# Altium footprint library Pezo_imp.PCBLIB: 98 footprints (part 4 of 7)
Each footprint in its own frame and in the unit in brackets; x right, y up, seen from the top. Pads: shape width x height; smd on the part's side, far side on the other; paste and mask are expansions set on the pad; w line width, h text height; cw(c..) or ccw(c..) is an arc to the next point about the centre after c.
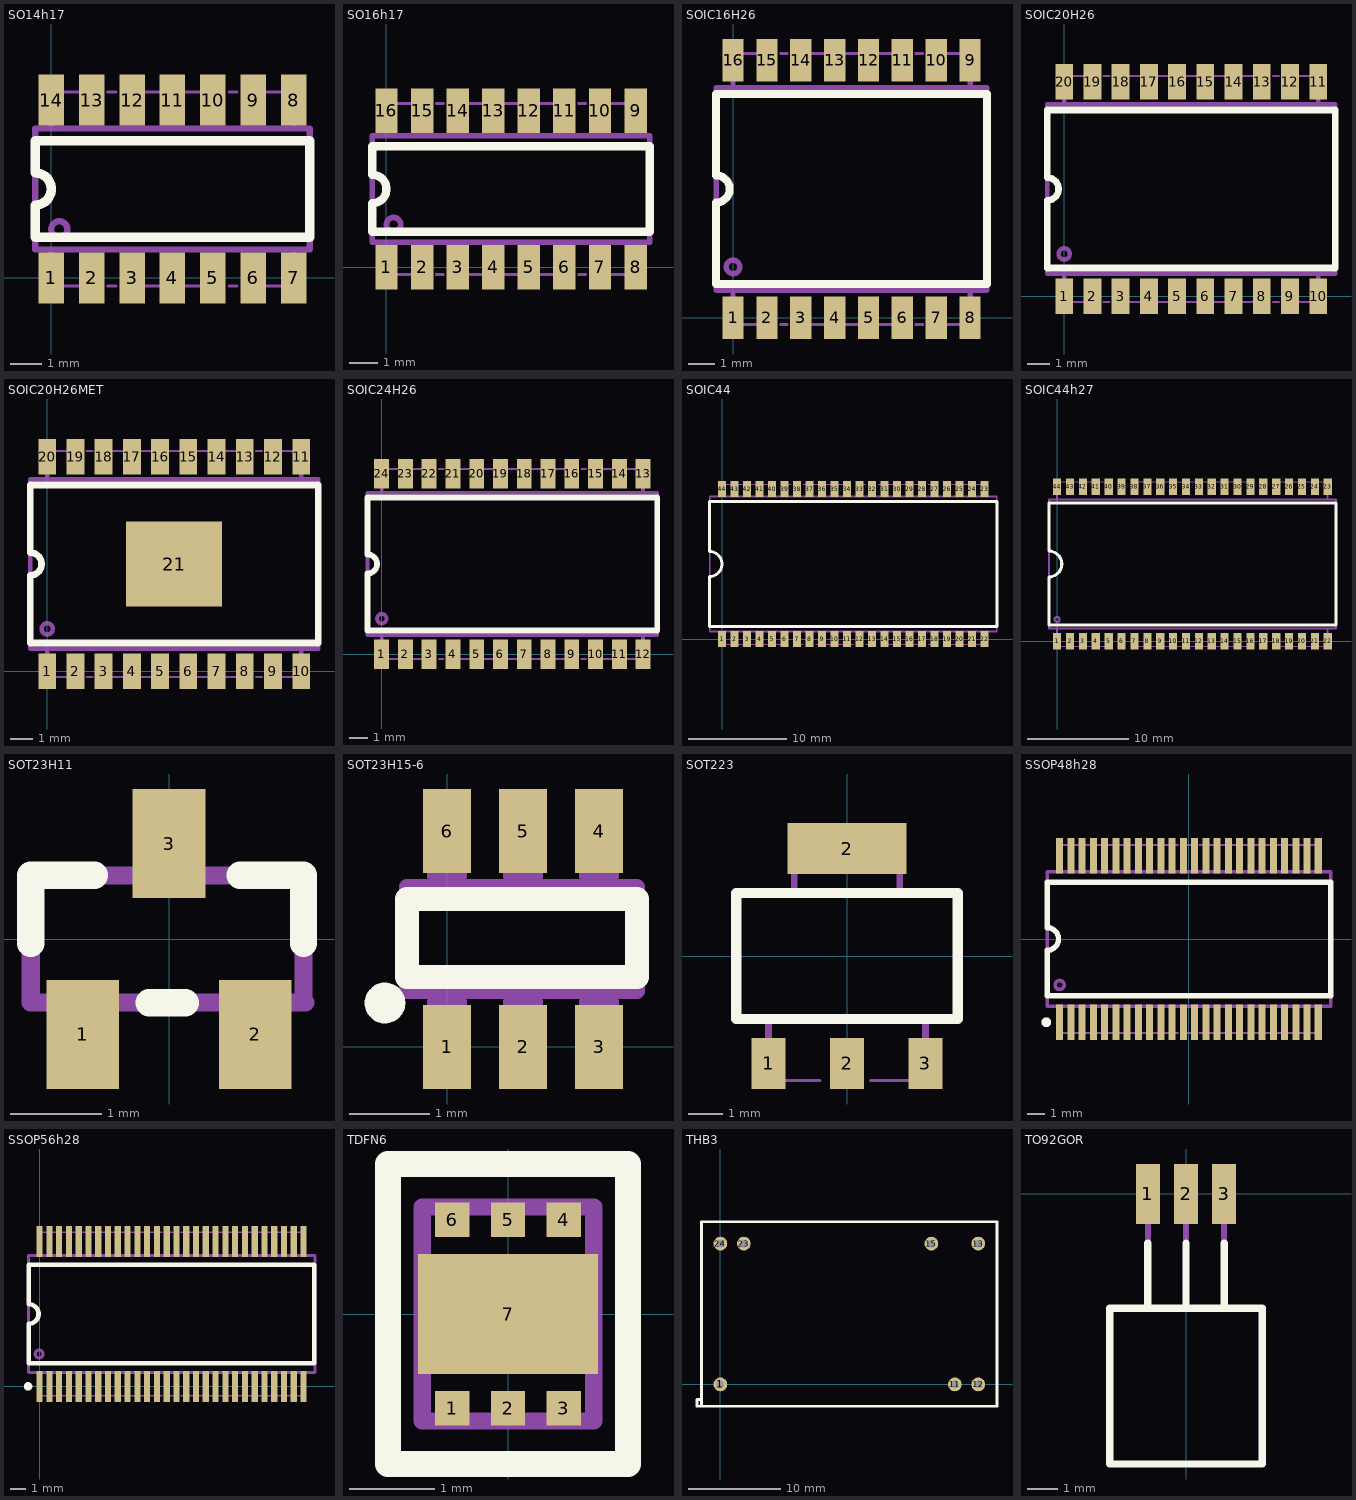
[diagram p3: the footprints below, top view; thin cyan lines are the x and y axes]

## SO14h17 [mm]
height 1.7
pads (14):
  rect 0.8x1.6 smd: 1(0,0) 2(1.27,0) 3(2.54,0) 4(3.81,0) 5(5.08,0) 6(6.35,0) 7(7.62,0) 8(7.62,5.588) 9(6.35,5.588) 10(5.08,5.588) 11(3.81,5.588) 12(2.54,5.588) 13(1.27,5.588) 14(0,5.588)
Top Overlay:
  lines w0.3: -0.508,1.27 8.128,1.27 8.128,4.318 -0.508,4.318 -0.508,3.302 cw(c-0.508,2.794) -0.508,2.286 -0.508,1.27
Mechanical 1:
  circle w0.2: c0.254,1.524 r0.254
  lines w0.1: 0,-0.254 1.27,-0.254 ; 0,5.842 1.27,5.842 ; 1.778,-0.254 2.032,-0.254 ; 1.778,5.842 2.032,5.842 ; 2.54,-0.254 5.08,-0.254 ; 2.54,5.842 5.08,5.842 ; 5.588,-0.254 5.842,-0.254 ; 5.588,5.842 5.842,5.842 ; 6.35,-0.254 7.62,-0.254 ; 6.35,5.842 7.62,5.842
  lines w0.2: 0,-0.254 0,0.762 ; 0,4.826 0,5.842 ; 7.62,-0.254 7.62,0.762 ; 7.62,4.826 7.62,5.842 ; -0.508,0.889 8.128,0.889 8.128,4.699 -0.508,4.699 -0.508,0.889
  text ".Designator" at 2.05,3.48 h1.5
  text ".Comment" at 0.97,2.06 h1.5
  text "14" at 0.01,3.4 h1.5
3D body "SO14h17.stp": height 1.71, standoff 0, extent -0.6,-0.35 8.21,5.95

## SO16h17 [mm]
height 1.7
pads (16):
  rect 0.8x1.6 smd: 1(0,0) 2(1.27,0) 3(2.54,0) 4(3.81,0) 5(5.08,0) 6(6.35,0) 7(7.62,0) 8(8.89,0) 9(8.89,5.588) 10(7.62,5.588) 11(6.35,5.588) 12(5.08,5.588) 13(3.81,5.588) 14(2.54,5.588) 15(1.27,5.588) 16(0,5.588)
Top Overlay:
  lines w0.3: -0.508,1.27 9.398,1.27 9.398,4.318 -0.508,4.318 -0.508,3.302 cw(c-0.508,2.794) -0.508,2.286 -0.508,1.27
Mechanical 1:
  circle w0.2: c0.254,1.524 r0.254
  lines w0.1: 0,-0.254 1.27,-0.254 ; 0,5.842 1.27,5.842 ; 1.778,-0.254 2.032,-0.254 ; 1.778,5.842 2.032,5.842 ; 2.54,-0.254 6.35,-0.254 ; 2.54,5.842 6.35,5.842 ; 6.858,-0.254 7.112,-0.254 ; 6.858,5.842 7.112,5.842 ; 7.62,-0.254 8.89,-0.254 ; 7.62,5.842 8.89,5.842
  lines w0.2: 0,-0.254 0,0.762 ; 0,4.826 0,5.842 ; 8.89,-0.254 8.89,0.762 ; 8.89,4.826 8.89,5.842 ; -0.508,0.889 9.398,0.889 9.398,4.699 -0.508,4.699 -0.508,0.889
  text ".Comment" at 1.47,1.76 h1.5
  text ".Designator" at 2.55,3.18 h1.5
  text "16" at -0.127,3.556 h1.5
3D body "SO16h17.stp": height 1.71, standoff 0, extent -0.595,-0.356 9.485,5.944

## SOIC16H26 [mm]
height 2.6
pads (16):
  rect 0.8x1.6 smd: 1(0,0) 2(1.27,0) 3(2.54,0) 4(3.81,0) 5(5.08,0) 6(6.35,0) 7(7.62,0) 8(8.89,0) 9(8.89,9.652) 10(7.62,9.652) 11(6.35,9.652) 12(5.08,9.652) 13(3.81,9.652) 14(2.54,9.652) 15(1.27,9.652) 16(0,9.652)
Top Overlay:
  lines w0.3: -0.635,1.27 9.525,1.27 9.525,8.382 -0.635,8.382 -0.635,5.334 cw(c-0.635,4.826) -0.635,4.318 -0.635,1.27
Mechanical 1:
  circle w0.2: c0,1.905 r0.254
  lines w0.1: 0,-0.254 1.27,-0.254 ; 0,9.906 1.27,9.906 ; 1.778,-0.254 2.032,-0.254 ; 1.778,9.906 2.032,9.906 ; 2.54,-0.254 6.35,-0.254 ; 2.54,9.906 6.35,9.906 ; 6.858,-0.254 7.112,-0.254 ; 6.858,9.906 7.112,9.906 ; 7.62,-0.254 8.89,-0.254 ; 7.62,9.906 8.89,9.906
  lines w0.2: 0,-0.254 0,1.016 ; 0,8.636 0,9.906 ; 8.89,-0.254 8.89,1.016 ; 8.89,8.636 8.89,9.906 ; -0.635,1.016 9.525,1.016 9.525,8.636 -0.635,8.636 -0.635,1.016
  text ".Designator" at 2.78,5.28 h1.5
  text ".Comment" at 1.19,3.58 h1.5
  text "16" at 0,7 h1.5
3D body "SOIC16h26.stp": height 2.61, standoff 0, extent -0.8,-0.5 9.7,10.15

## SOIC20H26 [mm]
height 2.6
pads (20):
  rect 0.8x1.6 smd: 1(0,0) 2(1.27,0) 3(2.54,0) 4(3.81,0) 5(5.08,0) 6(6.35,0) 7(7.62,0) 8(8.89,0) 9(10.16,0) 10(11.43,0) 11(11.43,9.652) 12(10.16,9.652) 13(8.89,9.652) 14(7.62,9.652) 15(6.35,9.652) 16(5.08,9.652) 17(3.81,9.652) 18(2.54,9.652) 19(1.27,9.652) 20(0,9.652)
Top Overlay:
  lines w0.3: -0.76,1.27 12.19,1.27 12.19,8.382 -0.76,8.382 -0.76,5.334 cw(c-0.76,4.826) -0.76,4.318 -0.76,1.27
Mechanical 1:
  circle w0.2: c0,1.905 r0.254
  lines w0.1: 0,-0.254 1.27,-0.254 ; 0,9.906 1.27,9.906 ; 1.778,-0.254 2.032,-0.254 ; 1.778,9.906 2.032,9.906 ; 2.54,-0.254 8.89,-0.254 ; 2.54,9.906 8.89,9.906 ; 9.398,-0.254 9.652,-0.254 ; 9.398,9.906 9.652,9.906 ; 10.16,-0.254 11.43,-0.254 ; 10.16,9.906 11.43,9.906
  lines w0.2: 0,-0.254 0,1.016 ; 0,8.636 0,9.906 ; 11.43,-0.254 11.43,1.016 ; 11.43,8.636 11.43,9.906 ; -0.76,1.016 12.19,1.016 12.19,8.636 -0.76,8.636 -0.76,1.016
  text ".Designator" at 4.455,5.28 h1.5
  text ".Comment" at 2.865,3.58 h1.5
  text "20" at 0,7 h1.5
3D body "SOIC20h26.stp": height 2.61, standoff 0, extent -0.76,-0.499 12.19,10.151

## SOIC20H26MET [mm]
height 2.6
pads (21):
  rect 0.8x1.6 smd: 1(0,0) 2(1.27,0) 3(2.54,0) 4(3.81,0) 5(5.08,0) 6(6.35,0) 7(7.62,0) 8(8.89,0) 9(10.16,0) 10(11.43,0) 11(11.43,9.652) 12(10.16,9.652) 13(8.89,9.652) 14(7.62,9.652) 15(6.35,9.652) 16(5.08,9.652) 17(3.81,9.652) 18(2.54,9.652) 19(1.27,9.652) 20(0,9.652)
  rect 4.32x3.81 smd: 21(5.715,4.826)
Top Overlay:
  lines w0.3: -0.76,1.27 12.19,1.27 12.19,8.382 -0.76,8.382 -0.76,5.334 cw(c-0.76,4.826) -0.76,4.318 -0.76,1.27
Mechanical 1:
  circle w0.2: c0,1.905 r0.254
  lines w0.1: 0,-0.254 1.27,-0.254 ; 0,9.906 1.27,9.906 ; 1.778,-0.254 2.032,-0.254 ; 1.778,9.906 2.032,9.906 ; 2.54,-0.254 8.89,-0.254 ; 2.54,9.906 8.89,9.906 ; 9.398,-0.254 9.652,-0.254 ; 9.398,9.906 9.652,9.906 ; 10.16,-0.254 11.43,-0.254 ; 10.16,9.906 11.43,9.906
  lines w0.2: 0,-0.254 0,1.016 ; 0,8.636 0,9.906 ; 11.43,-0.254 11.43,1.016 ; 11.43,8.636 11.43,9.906 ; -0.76,1.016 12.19,1.016 12.19,8.636 -0.76,8.636 -0.76,1.016
  text ".Designator" at 4.455,5.28 h1.5
  text ".Comment" at 2.865,3.58 h1.5
  text "20" at 0,7 h1.5
3D body "SOIC20h26.stp": height 2.61, standoff 0, extent -0.76,-0.499 12.19,10.151

## SOIC24H26 [mm]
height 2.6
pads (24):
  rect 0.8x1.6 smd: 1(0,0) 2(1.27,0) 3(2.54,0) 4(3.81,0) 5(5.08,0) 6(6.35,0) 7(7.62,0) 8(8.89,0) 9(10.16,0) 10(11.43,0) 11(12.7,0) 12(13.97,0) 13(13.97,9.652) 14(12.7,9.652) 15(11.43,9.652) 16(10.16,9.652) 17(8.89,9.652) 18(7.62,9.652) 19(6.35,9.652) 20(5.08,9.652) 21(3.81,9.652) 22(2.54,9.652) 23(1.27,9.652) 24(0,9.652)
Top Overlay:
  lines w0.3: -0.76,1.27 -0.76,4.318 ccw(c-0.76,4.826) -0.76,5.334 -0.76,8.382 14.73,8.382 14.73,1.27 -0.76,1.27
Mechanical 1:
  circle w0.2: c0,1.905 r0.254
  lines w0.1: 0,-0.254 2.54,-0.254 ; 0,9.906 2.54,9.906 ; 3.048,-0.254 3.302,-0.254 ; 3.048,9.906 3.302,9.906 ; 3.81,-0.254 10.16,-0.254 ; 3.81,9.906 10.16,9.906 ; 10.668,-0.254 10.922,-0.254 ; 10.668,9.906 10.922,9.906 ; 11.43,-0.254 13.97,-0.254 ; 11.43,9.906 13.97,9.906
  lines w0.2: 0,-0.254 0,1.016 ; 0,8.636 0,9.906 ; 13.97,-0.254 13.97,1.016 ; 13.97,8.636 13.97,9.906 ; -0.76,1.016 -0.76,8.636 14.73,8.636 14.73,1.016 -0.76,1.016
  text "24" at 0,7 h1.5
  text ".Comment" at 3.88,3.605 h1.5
  text ".Designator" at 5.85,5.311 h1.5
3D body "SOIC24h26.stp": height 2.61, standoff 0, extent -0.76,-0.499 14.73,10.151

## SOIC44 [mil]
height 106.3
pads (44):
  rect 32x63 smd: 1(0,0) 2(50,0) 3(100,0) 4(150,0) 5(200,0) 6(250,0) 7(300,0) 8(350,0) 9(400,0) 10(450,0) 11(500,0) 12(550,0) 13(600,0) 14(650,0) 15(700,0) 16(750,0) 17(800,0) 18(850,0) 19(900,0) 20(950,0) 21(1000,0) 22(1050,0) 23(1050,600) 24(1000,600) 25(950,600) 26(900,600) 27(850,600) 28(800,600) 29(750,600) 30(700,600) 31(650,600) 32(600,600) 33(550,600) 34(500,600) 35(450,600) 36(400,600) 37(350,600) 38(300,600) 39(250,600) 40(200,600) 41(150,600) 42(100,600) 43(50,600) 44(0,600)
Top Overlay:
  lines w11.81: -50,50 -50,250 ccw(c-50,300) -50,350 -50,550 1100,550 1100,50 -50,50
Mechanical 1:
  lines w3.94: 0,-20 25,-20 50,-20 100,-20 250,-20 ; 0,620 200,620 ; 250,620 275,620 ; 300,-20 325,-20 ; 325,620 500,620 ; 375,-20 525,-20 ; 550,620 575,620 ; 575,-20 600,-20 ; 625,620 800,620 ; 650,-20 800,-20 ; 825,-20 850,-20 ; 825,620 850,620 ; 900,-20 1050,-20 ; 900,620 1050,620
  lines w7.87: 0,-20 0,30 ; 0,570 0,620 ; 1050,-20 1050,30 ; 1050,570 1050,620 ; -49,30 -49,570 1099,570 1099,30 -49,30
  text "1" at -28.65,50.52 h59.06
  text "44" at -19.68,511.81 h59.06

## SOIC44h27 [mm]
height 2.7
pads (44):
  rect 0.8x1.6 smd: 1(0,0) 2(1.27,0) 3(2.54,0) 4(3.81,0) 5(5.08,0) 6(6.35,0) 7(7.62,0) 8(8.89,0) 9(10.16,0) 10(11.43,0) 11(12.7,0) 12(13.97,0) 13(15.24,0) 14(16.51,0) 15(17.78,0) 16(19.05,0) 17(20.32,0) 18(21.59,0) 19(22.86,0) 20(24.13,0) 21(25.4,0) 22(26.67,0) 23(26.67,15.24) 24(25.4,15.24) 25(24.13,15.24) 26(22.86,15.24) 27(21.59,15.24) 28(20.32,15.24) 29(19.05,15.24) 30(17.78,15.24) 31(16.51,15.24) 32(15.24,15.24) 33(13.97,15.24) 34(12.7,15.24) 35(11.43,15.24) 36(10.16,15.24) 37(8.89,15.24) 38(7.62,15.24) 39(6.35,15.24) 40(5.08,15.24) 41(3.81,15.24) 42(2.54,15.24) 43(1.27,15.24) 44(0,15.24)
Top Overlay:
  lines w0.3: -0.815,1.62 27.485,1.62 27.485,13.62 -0.815,13.62 -0.815,8.89 cw(c-0.815,7.62) -0.815,6.35 -0.815,1.62 ; -0.815,1.62 -0.77,1.62 -0.815,1.62
Mechanical 1:
  circle w0.2: c0,2.159 r0.254
  lines w0.1: 0,-0.508 5.08,-0.508 ; 0,15.748 5.08,15.748 ; 6.223,-0.508 6.477,-0.508 ; 6.223,15.748 6.477,15.748 ; 7.62,-0.508 19.05,-0.508 ; 7.62,15.748 19.05,15.748 ; 20.193,-0.508 20.447,-0.508 ; 20.193,15.748 20.447,15.748 ; 21.59,-0.508 26.67,-0.508 ; 21.59,15.748 26.67,15.748
  lines w0.2: 0,-0.508 0,1.28 ; 0,13.96 0,15.748 ; 26.67,-0.508 26.67,1.28 ; 26.67,13.96 26.67,15.748 ; -0.8,1.28 -0.8,13.96 27.47,13.96 27.47,1.28 -0.8,1.28
  text ".Comment" at 10.866,6.501 h1.5
  text ".Designator" at 12.456,8.201 h1.5
  text "44" at 0,12.446 h1.5
3D body "SOIC44h27.stp": height 2.71, standoff 0, extent -0.8,-0.53 27.47,15.77

## SOT23H11 [mm]
height 1.1
pads (3):
  rect 0.8x1.2 smd: 1(-0.95,-1.05) 2(0.95,-1.05) 3(0,1.05)
Top Overlay:
  lines w0.3: -1.52,-0.05 -1.52,0.7 -0.82,0.7 ; -0.22,-0.7 0.18,-0.7 ; 0.78,0.7 1.48,0.7 1.48,-0.05
Mechanical 1:
  lines w0.2: -0.97,-1.3 -0.97,-0.7 ; 0,0.7 0,1.3 ; 0.93,-1.3 0.93,-0.7 ; 1.48,-0.7 1.48,0.7 ; 1.5,-0.7 -1.52,-0.7 -1.52,0.7 1.5,0.7
  text ".Comment" at -2.72,-2.58 h1.5
  text ".Designator" at -1.66,1.85 h1.5
3D body "SOT23h11.stp": height 1.1, standoff 0, extent -1.5,-1.25 1.5,1.25

## SOT23H15-6 [mm]
height 1.5
pads (6):
  rect 0.6x1.05 smd: 1(0,0) 2(0.95,0) 3(1.9,0) 4(1.9,2.7) 5(0.95,2.7) 6(0,2.7)
Top Overlay:
  circle w0.254: c-0.777,0.55 r0.127
  lines w0.3: -0.5,0.875 2.375,0.875 2.375,1.85 -0.5,1.85 -0.5,0.875
Mechanical 1:
  lines w0.2: -0.025,2 0,2 ; -0.5,0.7 2.375,0.7 2.375,2 -0.5,2 -0.5,0.7
  lines w0.5: 0,-0.15 0,0.55 ; 0,2.15 0,2.85 ; 0.95,-0.15 0.95,0.55 ; 0.95,2.15 0.95,2.85 ; 1.9,-0.15 1.9,0.55 ; 1.9,2.15 1.9,2.85
  text ".Designator" at -0.7,3.25 h1.5
  text ".Comment" at -0.823,-1.452 h1.5
  text "1" at -1.3,-0.85 h1.5

## SOT223 [mm]
height 1.7
pads (4):
  rect 1x1.5 smd: 1(-2.3,-3.15) 2(0,-3.15) 3(2.3,-3.15)
  rect 3.5x1.5 smd: 2(0,3.15)
Top Overlay:
  lines w0.3: -3.25,-1.85 -3.25,1.85 3.25,1.85 3.25,-1.85 -3.25,-1.85
Mechanical 1:
  lines w0.1: -2.3,-3.65 -0.8,-3.65 ; -0.175,-3.65 0.075,-3.65 ; 0.7,-3.65 2.3,-3.65
  lines w0.2: -2.3,-3.65 -2.3,-1.9 ; -1.55,1.85 -1.55,3.65 1.55,3.65 1.55,1.85 ; 2.3,-3.65 2.3,-1.9 ; -3.25,-1.85 -3.25,1.85 3.25,1.85 3.25,-1.85 -3.25,-1.85
  text "2" at -0.2,0.55 h1.5
  text "3" at 2,-1.45 h1.5
  text "1" at -2.5,-1.4 h1.5
  text ".Comment" at -2.9,-5.15 h1.5
  text ".Designator" at -2.26,4.55 h1.5
3D body "SOT223.stp": height 1.7, standoff 0, extent -3.25,-3.65 3.25,3.65

## SSOP48h28 [mm]
height 2.8
pads (48):
  rect 0.4x2 smd: 1(-7.302,-4.7) 2(-6.667,-4.7) 3(-6.032,-4.7) 4(-5.397,-4.7) 5(-4.763,-4.7) 6(-4.127,-4.7) 7(-3.492,-4.7) 8(-2.857,-4.7) 9(-2.222,-4.7) 10(-1.587,-4.7) 11(-0.953,-4.7) 12(-0.318,-4.7) 13(0.318,-4.7) 14(0.953,-4.7) 15(1.587,-4.7) 16(2.222,-4.7) 17(2.857,-4.7) 18(3.492,-4.7) 19(4.127,-4.7) 20(4.763,-4.7) 21(5.397,-4.7) 22(6.032,-4.7) 23(6.667,-4.7) 24(7.302,-4.7) 25(7.302,4.7) 26(6.667,4.7) 27(6.032,4.7) 28(5.397,4.7) 29(4.763,4.7) 30(4.127,4.7) 31(3.492,4.7) 32(2.857,4.7) 33(2.222,4.7) 34(1.587,4.7) 35(0.953,4.7) 36(0.318,4.7) 37(-0.318,4.7) 38(-0.953,4.7) 39(-1.587,4.7) 40(-2.222,4.7) 41(-2.857,4.7) 42(-3.492,4.7) 43(-4.127,4.7) 44(-4.763,4.7) 45(-5.397,4.7) 46(-6.032,4.7) 47(-6.667,4.7) 48(-7.302,4.7)
Top Overlay:
  circle w0.3: c-8.053,-4.7 r0.125
  lines w0.3: -8,-3.2 8,-3.2 8,3.2 -8,3.2 -8,0.635 cw(c-8,0) -8,-0.635 -8,-3.2
Mechanical 1:
  circle w0.2: c-7.3,-2.595 r0.254
  lines w0.1: -7.3,-5.3 -0.6,-5.3 ; -7.3,5.3 -0.6,5.3 ; -0.1,-5.3 0.1,-5.3 ; -0.1,5.3 0.1,5.3 ; 0.6,-5.3 7.3,-5.3 ; 0.6,5.3 7.3,5.3
  lines w0.2: -7.3,-5.3 -7.3,-3.8 ; -7.3,3.8 -7.3,5.3 ; 7.3,-5.3 7.3,-3.8 ; 7.3,3.8 7.3,5.3 ; -8,-3.8 8,-3.8 8,3.8 -8,3.8 -8,-3.8
  text "48" at -7.4,2.3 h1.5
  text ".Comment" at -2.735,-1.12 h1.5
  text ".Designator" at -1.145,0.58 h1.5
3D body "SSOP48h28.stp": height 1.71, standoff 0, extent -7.997,-5.3 8.003,5.3

## SSOP56h28 [mm]
height 2.8
pads (56):
  rect 0.4x2 smd: 1(0,0) 2(0.635,0) 3(1.27,0) 4(1.905,0) 5(2.54,0) 6(3.175,0) 7(3.81,0) 8(4.445,0) 9(5.08,0) 10(5.715,0) 11(6.35,0) 12(6.985,0) 13(7.62,0) 14(8.255,0) 15(8.89,0) 16(9.525,0) 17(10.16,0) 18(10.795,0) 19(11.43,0) 20(12.065,0) 21(12.7,0) 22(13.335,0) 23(13.97,0) 24(14.605,0) 25(15.24,0) 26(15.875,0) 27(16.51,0) 28(17.145,0) 29(17.145,9.4) 30(16.51,9.4) 31(15.875,9.4) 32(15.24,9.4) 33(14.605,9.4) 34(13.97,9.4) 35(13.335,9.4) 36(12.7,9.4) 37(12.065,9.4) 38(11.43,9.4) 39(10.795,9.4) 40(10.16,9.4) 41(9.525,9.4) 42(8.89,9.4) 43(8.255,9.4) 44(7.62,9.4) 45(6.985,9.4) 46(6.35,9.4) 47(5.715,9.4) 48(5.08,9.4) 49(4.445,9.4) 50(3.81,9.4) 51(3.175,9.4) 52(2.54,9.4) 53(1.905,9.4) 54(1.27,9.4) 55(0.635,9.4) 56(0,9.4)
Top Overlay:
  circle w0.3: c-0.75,0 r0.125
  lines w0.3: -0.702,1.5 -0.702,4.065 ccw(c-0.702,4.7) -0.702,5.335 -0.702,7.9 17.848,7.9 17.848,1.5 -0.702,1.5
Mechanical 1:
  circle w0.2: c-0.028,2.105 r0.254
  lines w0.1: -0.028,-0.6 7.973,-0.6 ; -0.028,10 7.973,10 ; 8.473,-0.6 8.672,-0.6 ; 8.473,10 8.672,10 ; 9.172,-0.6 17.173,-0.6 ; 9.172,10 17.173,10
  lines w0.2: -0.028,-0.6 -0.028,0.9 ; -0.028,8.5 -0.028,10 ; 17.173,-0.6 17.173,0.9 ; 17.173,8.5 17.173,10 ; -0.727,0.9 -0.727,8.5 17.872,8.5 17.872,0.9 -0.727,0.9
  text ".Designator" at 7.427,5.28 h1.5
  text ".Comment" at 5.837,3.58 h1.5
  text "56" at -0.128,7 h1.5
3D body "SSOP56h28.stp": height 1.71, standoff 0, extent -0.727,-0.6 17.873,10

## TDFN6 [mm]
height 0.8
pads (7):
  rect 0.4x0.4 smd: 1(-0.65,-1.1) 2(0,-1.1) 3(0.65,-1.1) 4(0.65,1.1) 5(0,1.1) 6(-0.65,1.1)
  rect 2.1x1.4 smd: 7(0,0)
Top Overlay:
  lines w0.3: -1.4,-1.75 -1.4,1.75 1.4,1.75 1.4,-1.75 -1.4,-1.75
Mechanical 1:
  circle w0.1: c-0.6,-0.5 r0.1
  lines w0.2: -1,-1.25 1,-1.25 1,1.25 -1,1.25 -1,-1.25
  text ".Designator" at -0.17,2.12 h1.5
  text ".Comment" at -2.64,-2.57 h1.5
  text "6" at -1,1.75 h1.5
3D body "TDFN6.stp": height 0.8, standoff 0, extent -1.025,-1.295 1.025,1.305

## THB3 [mm]
height 10
pads (7):
  round 1.5 hole 0.8: 1(0,0) 11(25.4,0) 12(27.94,0) 13(27.94,15.24) 15(22.86,15.24) 23(2.54,15.24) 24(0,15.24)
Top Overlay:
  lines w0.3: -2.03,-1.63 -2.53,-1.63 -2.53,-2.38 -2.03,-2.38 ; -2.03,-2.38 -2.03,17.62 29.97,17.62 29.97,-2.38 -2.03,-2.38
Mechanical 1:
  lines w0.2: -2.03,-2.38 -2.03,17.62 29.97,17.62 29.97,-2.38 -2.03,-2.38
  text "24" at -0.53,14.62 h1.5
  text "1" at -0.03,-0.38 h1.5
  text "13" at 27.47,14.62 h1.5
  text "12" at 26.97,-0.38 h1.5
  text ".Comment" at 10.19,6.5 h1.5
  text ".Designator" at 11.78,8.2 h1.5
3D body "THB3.stp": height 10.01, standoff -3, extent -2.03,-2.38 29.97,17.62

## TO92GOR [mm]
height 5.2
pads (3):
  rect 0.8x2 smd: 1(-1.27,0) 2(0,0) 3(1.27,0)
Top Overlay:
  lines w0.25: -1.27,-3.81 -1.27,-1.651 ; 0,-3.81 0,-1.651 ; 1.27,-3.81 1.27,-1.651 ; -2.54,-9.017 2.54,-9.017 2.54,-3.81 -2.54,-3.81 -2.54,-8.763 -2.54,-9.017
Mechanical 1:
  lines w0.2: -1.27,-3.81 -1.27,0.381 ; 0,-3.81 0,0.381 ; 1.27,-3.81 1.27,0.381 ; -2.54,-9.017 2.54,-9.017 2.54,-3.81 -2.54,-3.81 -2.54,-9.017
  text ".Designator" at -1.143,-7.366 h1.5
  text ".Comment" at -2.794,-10.287 h1.5
  text "1" at -1.628,-5.186 h1.5
  text "2" at -0.381,-5.207 h1.5
  text "3" at 1.039,-5.186 h1.5
3D body "TO92GOR.stp": height 0, standoff -4.18, extent -2.58,-9.01 2.58,0.5